# Altium footprint library IC.PcbLib: 108 footprints (part 6 of 8)
Each footprint in its own frame and in the unit in brackets; x right, y up, seen from the top. Pads: shape width x height; smd on the part's side, far side on the other; paste and mask are expansions set on the pad; w line width, h text height; cw(c..) or ccw(c..) is an arc to the next point about the centre after c.
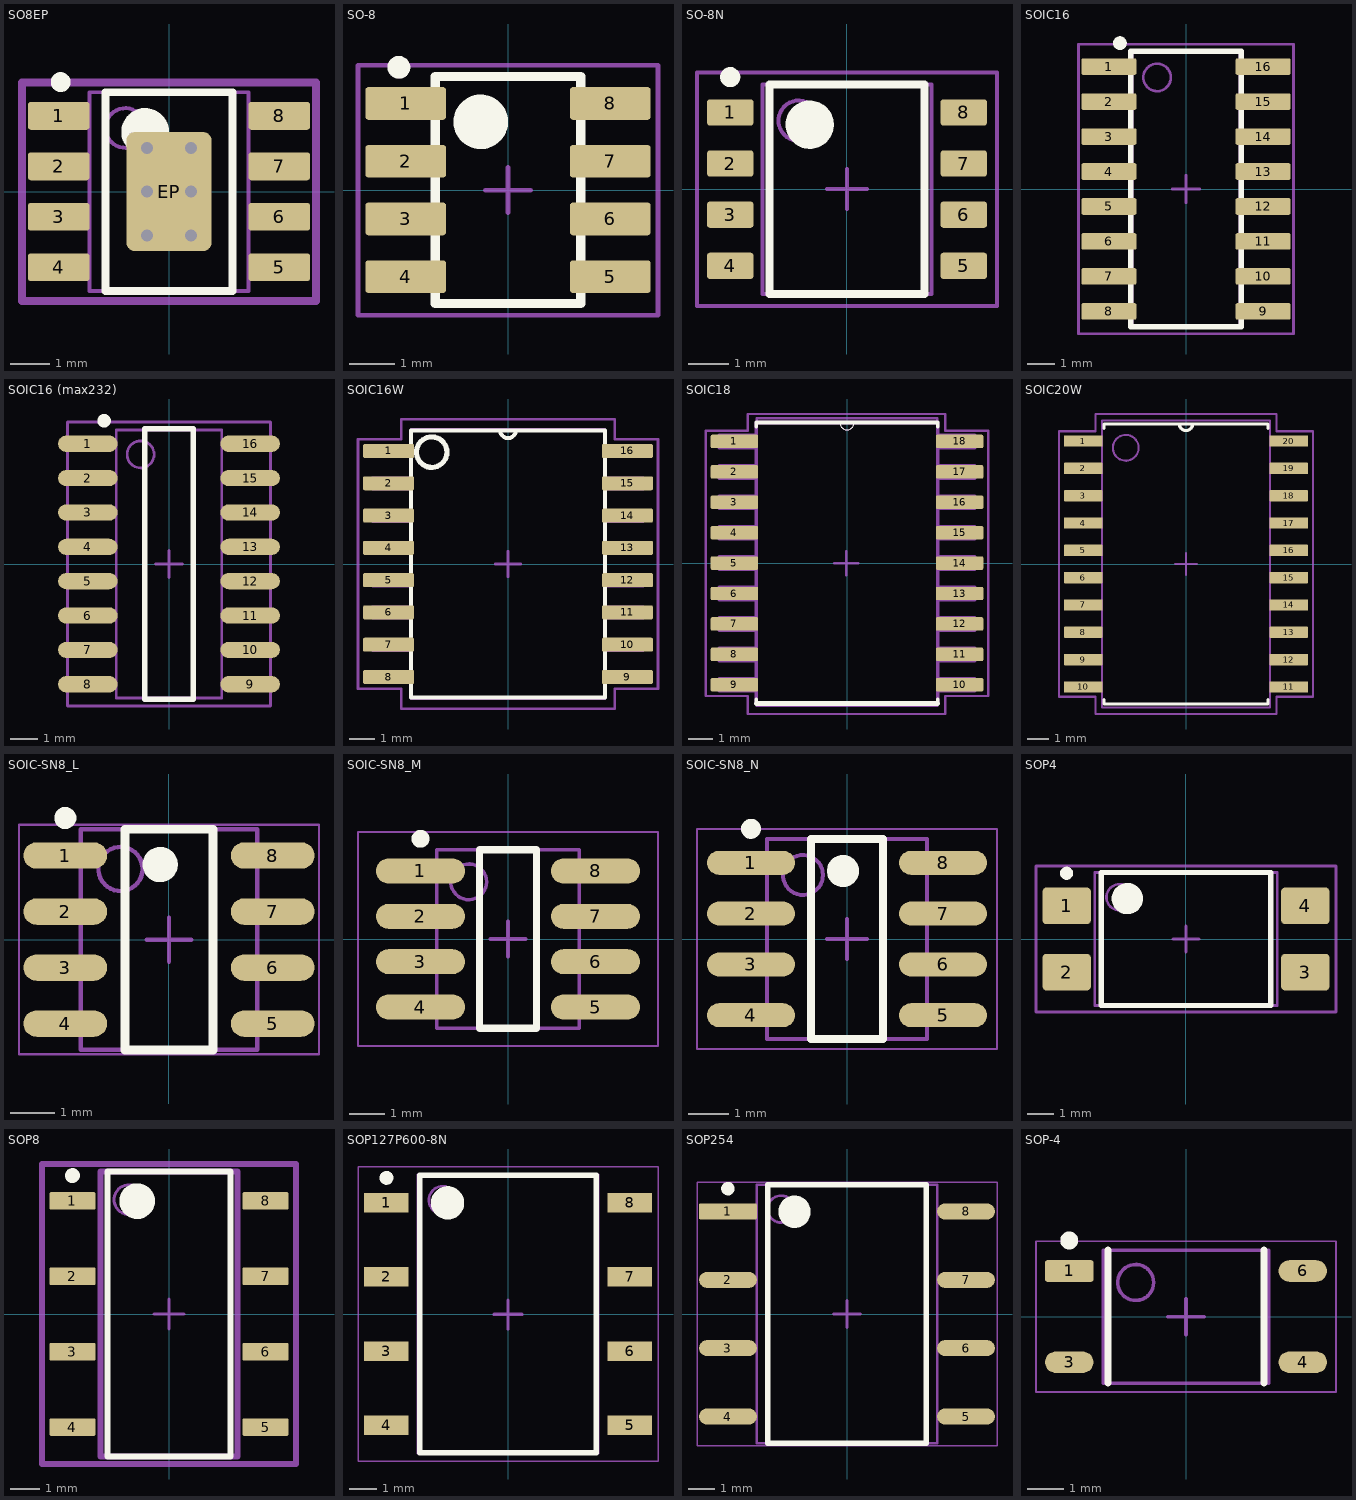
[diagram p5: the footprints below, top view; thin cyan lines are the x and y axes]

## SO8EP [mm] "SOIC, DDA, IPC Medium Density"
height 1.7
pads (9):
  rrect20% 1.55x0.7 smd: 1(-2.775,1.905) 2(-2.775,0.635) 3(-2.775,-0.635) 4(-2.775,-1.905) 5(2.775,-1.905) 6(2.775,-0.635) 7(2.775,0.635) 8(2.775,1.905)
  rrect20% 2.15x3 smd: EP(0,0)
via 0.55,-1.1 diameter 0.7 hole 0.3
via -0.55,-1.1 diameter 0.7 hole 0.3
via 0.55,0 diameter 0.7 hole 0.3
via -0.55,0 diameter 0.7 hole 0.3
via 0.55,1.1 diameter 0.7 hole 0.3
via -0.55,1.1 diameter 0.7 hole 0.3
Top Overlay:
  circle w0.6: c-0.6,1.5 r0.3
  circle w0.25: c-2.725,2.755 r0.125
  lines w0.2: -1.6,-2.5 1.6,-2.5 1.6,2.5 -1.6,2.5 -1.6,-2.5
M3_comm_top:
  text ".comment" at -3,-0.5 h2
M5_asm_top:
  circle w0.1: c-1.1,1.6 r0.5
  lines w0.1: -2,-2.5 2,-2.5 2,2.5 -2,2.5 -2,-2.5
  text ".Designator" at -2.5,3 h2
M7_courtyard_top:
  lines w0.2: -3.7,-2.75 3.7,-2.75 3.7,2.75 -3.7,2.75 -3.7,-2.75 ; -0.5,0 0.5,0 -0.5,0 ; 0,-0.5 0,0.5 0,-0.5
Mechanical 15:
  lines w0.05: -3.775,-2.75 3.775,-2.75 3.775,2.75 -3.775,2.75 -3.775,-2.75
  lines w0.1: -0.5,0 0.5,0 ; 0,-0.5 0,0.5
3D body "SOIC-8-1.step": height 1.75, standoff 0, extent -3,-2.45 3,2.45

## SO-8 [mm] "SOIC-8N,  IPC Medium Density"
height 1.75
pads (8):
  rrect20% 1.78x0.72 smd: 1(-2.25,1.905) 2(-2.25,0.635) 3(-2.25,-0.635) 4(-2.25,-1.905) 5(2.25,-1.905) 6(2.25,-0.635) 7(2.25,0.635) 8(2.25,1.905)
Top Overlay:
  circle w0.6: c-0.6,1.5 r0.3
  circle w0.25: c-2.4,2.7 r0.125
  lines w0.2: -1.6,-2.5 1.6,-2.5 1.6,2.5 -1.6,2.5 -1.6,-2.5
M3_comm_top:
  text ".comment" at 0,0 h1
M5_asm_top:
  circle w0.2: c-2.4,2.7 r0.141
  circle w0.1: c-0.6,1.5 r0.5
  lines w0.1: -1.6,-2.5 -1.6,2.5 1.6,2.5 1.6,-2.5 -1.6,-2.5
  text ".Designator" at -1.3,2.9 h1
M7_courtyard_top:
  lines w0.1: -3.3,-2.75 3.3,-2.75 3.3,2.75 -3.3,2.75 -3.3,-2.75 ; -0.5,0 0.5,0 -0.5,0 ; 0,-0.5 0,0.5 0,-0.5
3D body "SOIC-8-1.step": height 1.75, standoff 0, extent -3,-2.45 3,2.45

## SO-8N [mm] "HCPL-0630-500E, SOIC, 8-Leads, Body 5,14x4,07mm, Pitch 1,27mm, IPC Medium Density"
height 3.18
pads (8):
  rrect20% 1.15x0.65 smd: 1(-2.9,1.905) 2(-2.9,0.635) 3(-2.9,-0.635) 4(-2.9,-1.905) 5(2.9,-1.905) 6(2.9,-0.635) 7(2.9,0.635) 8(2.9,1.905)
Top Overlay:
  circle w0.25: c-2.9,2.78 r0.125
  circle w0.6: c-0.925,1.6 r0.3
  lines w0.2: -1.925,-2.6 -1.925,2.6 1.925,2.6 1.925,-2.6 -1.925,-2.6
M3_comm_top:
  text ".comment" at -1.2,-0.2 h1
M5_asm_top:
  circle w0.1: c-1.2,1.7 r0.5
  lines w0.1: -2.1,-2.6 -2.1,2.6 2.1,2.6 2.1,-2.6 -2.1,-2.6
  text ".Designator" at -1.525,2.775 h1
M7_courtyard_top:
  lines w0.1: -0.5,0 0.5,0 ; 0,-0.5 0,0.5 ; -3.725,-2.9 -3.725,2.9 3.725,2.9 3.725,-2.9 -3.725,-2.9
3D body: height 3.18, standoff 1.52, extent -2.1,-2.6 2.1,2.6

## SOIC16 [mm] "16-Pin Small Outline Integrated Circuit 1.27 mm Pitch, IPC Medium Density"
height 1.75
pads (16):
  rrect20% 2x0.6 smd: 1(-2.8,4.445) 2(-2.8,3.175) 3(-2.8,1.905) 4(-2.8,0.635) 5(-2.8,-0.635) 6(-2.8,-1.905) 7(-2.8,-3.175) 8(-2.8,-4.445) 9(2.8,-4.445) 10(2.8,-3.175) 11(2.8,-1.905) 12(2.8,-0.635) 13(2.8,0.635) 14(2.8,1.905) 15(2.8,3.175) 16(2.8,4.445)
Top Overlay:
  circle w0.25: c-2.4,5.295 r0.125
  lines w0.2: -2,-5 -2,5 2,5 2,-5 -2,-5
M3_comm_top:
  text ".comment" at 0,0 h1
M5_asm_top:
  lines w0.1: -2,-5 -2,5 2,5 2,-5 -2,-5
  lines w0.2: -2.305,5.268 cw(c-2.4,5.3) -2.3,5.3
  text ".Designator" at -2,5.5 h1
M7_courtyard_top:
  lines w0.1: -0.5,0 0.5,0 ; 0,-0.5 0,0.5 ; -3.9,-5.25 -3.9,5.25 3.9,5.25 3.9,-5.25 -3.9,-5.25
Mechanical 13:
  circle w0.1: c-1.05,4.05 r0.5
  lines w0.1: -1.95,-4.95 -1.95,4.95 1.95,4.95 1.95,-4.95 -1.95,-4.95
3D body "SOIC127P600X175-16N.stp": height 1.75, standoff 0, extent -3.1,-5 3.1,5

## SOIC16 (max232) [mm] "16-Pin Small Outline Integrated Circuit 1.27 mm Pitch, IPC Medium Density"
height 1.75
pads (16):
  oval 2.2x0.6 smd: 1(-3,4.445) 2(-3,3.175) 3(-3,1.905) 4(-3,0.635) 5(-3,-0.635) 6(-3,-1.905) 7(-3,-3.175) 8(-3,-4.445) 9(3,-4.445) 10(3,-3.175) 11(3,-1.905) 12(3,-0.635) 13(3,0.635) 14(3,1.905) 15(3,3.175) 16(3,4.445)
Top Overlay:
  circle w0.25: c-2.4,5.295 r0.125
  lines w0.2: -0.9,-5 0.9,-5 0.9,5 -0.9,5 -0.9,-5
Mechanical 13:
  circle w0.1: c-1.05,4.05 r0.5
  lines w0.1: -1.95,-4.95 1.95,-4.95 1.95,4.95 -1.95,4.95 -1.95,-4.95
Mechanical 15:
  lines w0.1: -0.5,0 0.5,0 ; 0,-0.5 0,0.5 ; -3.75,-5.25 3.75,-5.25 3.75,5.25 -3.75,5.25 -3.75,-5.25
3D body "SOIC127P600X175-16N.stp": height 1.75, standoff 0, extent -3.1,-5 3.1,5

## SOIC16W [mm] "ISOW7841DWER, ISOW7840DWER, ADUM4160_SOIC127P1032X265-16"
pads (16):
  rrect20% 2x0.55 smd: 1(-4.699,4.445) 2(-4.699,3.175) 3(-4.699,1.905) 4(-4.699,0.635) 5(-4.699,-0.635) 6(-4.699,-1.905) 7(-4.699,-3.175) 8(-4.699,-4.445) 9(4.699,-4.445) 10(4.699,-3.175) 11(4.699,-1.905) 12(4.699,-0.635) 13(4.699,0.635) 14(4.699,1.905) 15(4.699,3.175) 16(4.699,4.445)
Top Overlay:
  circle w0.2: c-3,4.4 r0.6
  lines w0.152: -3.81,5.055 -3.81,5.258 -0.305,5.258 ; -3.81,5.156 -3.81,-5.055 -3.81,-5.258 3.81,-5.258 3.81,-5.055 ; 3.81,-5.156 3.81,5.055 3.81,5.258 0.305,5.258 ; -0.305,5.258 ccw(c0,5.258) 0.305,5.258 ; -0.305,5.258 0.305,5.258
M3_comm_top:
  text ".comment" at -2.1,-0.2 h1
M4_comm_bot:
  lines w0: -5.334,-4.699 -5.334,-4.191 ; -5.334,-4.699 -3.81,-4.699 ; -5.334,-4.699 -5.334,-4.191 ; -5.334,-4.699 -3.81,-4.699 ; -5.334,-4.191 -3.81,-4.191 ; -5.334,-4.191 -3.81,-4.191 ; -5.334,-3.429 -5.334,-2.921 ; -5.334,-3.429 -3.81,-3.429 ; -5.334,-3.429 -5.334,-2.921 ; -5.334,-3.429 -3.81,-3.429 ; -5.334,-2.921 -3.81,-2.921 ; -5.334,-2.921 -3.81,-2.921 ; -5.334,-2.159 -5.334,-1.651 ; -5.334,-2.159 -3.81,-2.159 ; -5.334,-2.159 -5.334,-1.651 ; -5.334,-2.159 -3.81,-2.159 ; -5.334,-1.651 -3.81,-1.651 ; -5.334,-1.651 -3.81,-1.651 ; -5.334,-0.889 -5.334,-0.381 ; -5.334,-0.889 -3.81,-0.889 ; -5.334,-0.889 -5.334,-0.381 ; -5.334,-0.889 -3.81,-0.889 ; -5.334,-0.381 -3.81,-0.381 ; -5.334,-0.381 -3.81,-0.381 ; -5.334,0.381 -5.334,0.889 ; -5.334,0.381 -3.81,0.381 ; -5.334,0.381 -5.334,0.889 ; -5.334,0.381 -3.81,0.381 ; -5.334,0.889 -3.81,0.889 ; -5.334,0.889 -3.81,0.889 ; -5.334,1.651 -5.334,2.159 ; -5.334,1.651 -3.81,1.651 ; -5.334,1.651 -5.334,2.159 ; -5.334,1.651 -3.81,1.651 ; -5.334,2.159 -3.81,2.159 ; -5.334,2.159 -3.81,2.159 ; -5.334,2.921 -5.334,3.429 ; -5.334,2.921 -3.81,2.921 ; -5.334,2.921 -5.334,3.429 ; -5.334,2.921 -3.81,2.921 ; -5.334,3.429 -3.81,3.429 ; -5.334,3.429 -3.81,3.429 ; -5.334,4.191 -5.334,4.699 ; -5.334,4.191 -3.81,4.191 ; -5.334,4.191 -5.334,4.699 ; -5.334,4.191 -3.81,4.191 ; -5.334,4.699 -3.81,4.699 ; -5.334,4.699 -3.81,4.699 ; -3.81,-5.258 3.81,-5.258 ; -3.81,-5.258 -3.81,5.258 ; -3.81,-5.258 3.81,-5.258 ; -3.81,-5.258 -3.81,5.258 ; -3.81,-4.699 -3.81,-4.191 ; -3.81,-4.699 -3.81,-4.191 ; -3.81,-3.429 -3.81,-2.921 ; -3.81,-3.429 -3.81,-2.921 ; -3.81,-2.159 -3.81,-1.651 ; -3.81,-2.159 -3.81,-1.651 ; -3.81,-0.889 -3.81,-0.381 ; -3.81,-0.889 -3.81,-0.381 ; -3.81,0.381 -3.81,0.889 ; -3.81,0.381 -3.81,0.889 ; -3.81,1.651 -3.81,2.159 ; -3.81,1.651 -3.81,2.159 ; -3.81,2.921 -3.81,3.429 ; -3.81,2.921 -3.81,3.429 ; -3.81,4.191 -3.81,4.699 ; -3.81,4.191 -3.81,4.699 ; -3.81,5.258 -0.305,5.258 ; -3.81,5.258 -0.305,5.258 ; -0.305,5.258 ccw(c0,5.258) 0.305,5.258 ; -0.305,5.258 ccw(c0,5.258) 0.305,5.258 ; -0.305,5.258 0.305,5.258 ; -0.305,5.258 0.305,5.258 ; 0.305,5.258 3.81,5.258 ; 0.305,5.258 3.81,5.258 ; 3.81,-5.258 3.81,5.258 ; 3.81,-5.258 3.81,5.258 ; 3.81,-4.699 3.81,-4.191 ; 3.81,-4.699 5.334,-4.699 ; 3.81,-4.699 3.81,-4.191 ; 3.81,-4.699 5.334,-4.699 ; 3.81,-4.191 5.334,-4.191 ; 3.81,-4.191 5.334,-4.191 ; 3.81,-3.429 3.81,-2.921 ; 3.81,-3.429 5.334,-3.429 ; 3.81,-3.429 3.81,-2.921 ; 3.81,-3.429 5.334,-3.429 ; 3.81,-2.921 5.334,-2.921 ; 3.81,-2.921 5.334,-2.921 ; 3.81,-2.159 3.81,-1.651 ; 3.81,-2.159 5.334,-2.159 ; 3.81,-2.159 3.81,-1.651 ; 3.81,-2.159 5.334,-2.159 ; 3.81,-1.651 5.334,-1.651 ; 3.81,-1.651 5.334,-1.651 ; 3.81,-0.889 3.81,-0.381 ; 3.81,-0.889 5.334,-0.889 ; 3.81,-0.889 3.81,-0.381 ; 3.81,-0.889 5.334,-0.889 ; 3.81,-0.381 5.334,-0.381 ; 3.81,-0.381 5.334,-0.381 ; 3.81,0.381 3.81,0.889 ; 3.81,0.381 5.334,0.381 ; 3.81,0.381 3.81,0.889 ; 3.81,0.381 5.334,0.381 ; 3.81,0.889 5.334,0.889 ; 3.81,0.889 5.334,0.889 ; 3.81,1.651 3.81,2.159 ; 3.81,1.651 5.334,1.651 ; 3.81,1.651 3.81,2.159 ; 3.81,1.651 5.334,1.651 ; 3.81,2.159 5.334,2.159 ; 3.81,2.159 5.334,2.159 ; 3.81,2.921 3.81,3.429 ; 3.81,2.921 5.334,2.921 ; 3.81,2.921 3.81,3.429 ; 3.81,2.921 5.334,2.921 ; 3.81,3.429 5.334,3.429 ; 3.81,3.429 5.334,3.429 ; 3.81,4.191 3.81,4.699 ; 3.81,4.191 5.334,4.191 ; 3.81,4.191 3.81,4.699 ; 3.81,4.191 5.334,4.191 ; 3.81,4.699 5.334,4.699 ; 3.81,4.699 5.334,4.699 ; 5.334,-4.699 5.334,-4.191 ; 5.334,-4.699 5.334,-4.191 ; 5.334,-3.429 5.334,-2.921 ; 5.334,-3.429 5.334,-2.921 ; 5.334,-2.159 5.334,-1.651 ; 5.334,-2.159 5.334,-1.651 ; 5.334,-0.889 5.334,-0.381 ; 5.334,-0.889 5.334,-0.381 ; 5.334,0.381 5.334,0.889 ; 5.334,0.381 5.334,0.889 ; 5.334,1.651 5.334,2.159 ; 5.334,1.651 5.334,2.159 ; 5.334,2.921 5.334,3.429 ; 5.334,2.921 5.334,3.429 ; 5.334,4.191 5.334,4.699 ; 5.334,4.191 5.334,4.699
M5_asm_top:
  circle w0.1: c-3,4.4 r0.6
  lines w0.1: -3.8,-5.3 -3.8,5.3 3.8,5.3 3.8,-5.3 -3.8,-5.3
  text ".Designator" at -2,5.5 h1
M7_courtyard_top:
  lines w0.1: -0.5,0 0.5,0 ; 0,-0.5 0,0.5 ; -5.9,-4.9 -4.2,-4.9 -4.2,-5.7 4.2,-5.7 4.2,-4.9 5.9,-4.9 5.9,-4.2 5.9,4.9 4.2,4.9 4.2,5.7 -4.2,5.7 -4.2,4.9 -5.9,4.9 -5.9,-4.9
3D body "SOIC16_Wide_JEDEC_MS-013AA.step": height 2.67, standoff 0.02, extent -5.315,-5.25 5.315,5.25

## SOIC18 [mil]
pads (18):
  rrect20% 78x22 smd: 1(-185,200) 2(-185,150) 3(-185,100) 4(-185,50) 5(-185,0) 6(-185,-50) 7(-185,-100) 8(-185,-150) 9(-185,-200) 10(185,-200) 11(185,-150) 12(185,-100) 13(185,-50) 14(185,0) 15(185,50) 16(185,100) 17(185,150) 18(185,200)
Top Overlay:
  lines w0: -12,231 ccw(c0,231) 12,231
  lines w6: -149,-231 -149,-224 ; -149,224 -149,231 -12,231 12,231 149,231 149,224 ; 149,-231 149,-224
  lines w7.87: -149,-231 149,-231
M1_3D_TOP:
  lines w0: -12,231 ccw(c0,231) 12,231
  lines w6: -210,-210 -149,-210 -149,-190 -210,-190 -210,-210 ; -210,-160 -149,-160 -149,-140 -210,-140 -210,-160 ; -210,-110 -149,-110 -149,-90 -210,-90 -210,-110 ; -210,-60 -149,-60 -149,-40 -210,-40 -210,-60 ; -210,-10 -149,-10 -149,10 -210,10 -210,-10 ; -210,40 -149,40 -149,60 -210,60 -210,40 ; -210,90 -149,90 -149,110 -210,110 -210,90 ; -210,140 -149,140 -149,160 -210,160 -210,140 ; -210,190 -149,190 -149,210 -210,210 -210,190 ; -149,-231 -149,231 -12,231 12,231 149,231 149,-231 -149,-231 ; 149,-210 210,-210 210,-190 149,-190 149,-210 ; 149,-160 210,-160 210,-140 149,-140 149,-160 ; 149,-110 210,-110 210,-90 149,-90 149,-110 ; 149,-60 210,-60 210,-40 149,-40 149,-60 ; 149,-10 210,-10 210,10 149,10 149,-10 ; 149,40 210,40 210,60 149,60 149,40 ; 149,90 210,90 210,110 149,110 149,90 ; 149,140 210,140 210,160 149,160 149,140 ; 149,190 210,190 210,210 149,210 149,190
M3_comm_top:
  text ".comment" at -117.13,-18.7 h78.74
M5_asm_top:
  lines w3.94: -148.62,-234.25 148.62,-234.25 148.62,238.19 -148.62,238.19 -148.62,-234.25
  text ".Designator" at -114.17,251.97 h78.74
M7_courtyard_top:
  lines w3.94: -20.67,0 18.7,0 ; -0.98,-19.68 -0.98,19.68 ; -163.39,245.08 53.15,245.08 161.42,245.08 161.42,217.52 232.28,217.52 232.28,-218.5 229.33,-218.5 161.42,-218.5 161.42,-248.03 -163.39,-248.03 -163.39,-218.5 -232.28,-218.5 -232.28,217.52 -163.39,217.52 -163.39,245.08 ; -163.39,245.08 -163.39,245.08
3D body "User Library-SOIC18-300.step": height 104.33, standoff 0, extent -202.76,-226.97 202.75,226.97

## SOIC20W [mil]
pads (20):
  rrect20% 71x21 smd: 1(-188,225) 2(-188,175) 3(-188,125) 4(-188,75) 5(-188,25) 6(-188,-25) 7(-188,-75) 8(-188,-125) 9(-188,-175) 10(-188,-225) 11(188,-225) 12(188,-175) 13(188,-125) 14(188,-75) 15(188,-25) 16(188,25) 17(188,75) 18(188,125) 19(188,175) 20(188,225)
Top Overlay:
  lines w6: -150,-248 -150,-256 150,-256 150,-248 ; -150,248 -150,256 -12,256 ; 150,248 150,256 12,256 ; -12,256 ccw(c0,256) 12,256 ; -12,256 12,256
M3_comm_top:
  text ".comment" at -52.17,-10.83 h39.37
M5_asm_top:
  circle w3.94: c-110.24,212.6 r23.62
  lines w3.94: -153.54,-262.6 -153.54,262.6 153.54,262.6 153.54,-262.6 -153.54,-262.6
  text ".Designator" at -62.01,285.43 h39.37
M7_courtyard_top:
  lines w3.94: -19.69,0 19.68,0 ; 0,-19.68 0,19.68 ; -232.28,-242.91 -165.35,-242.91 -165.35,-274.41 165.35,-274.41 165.35,-242.91 232.28,-242.91 232.28,242.91 165.35,242.91 165.35,274.41 -165.35,274.41 -165.35,242.91 -232.28,242.91 -232.28,-242.91
3D body "User Library-SOIC20_W.STEP": height 104.33, standoff 0, extent -209.64,-255.9 209.65,255.9

## SOIC-SN8_L [mm] "SOIC, 8-Leads, Body 4.9x3.8mm, Pitch 1.27mm, IPC High Density"
height 1.75
pads (8):
  oval 1.9x0.6 smd: 1(-2.35,1.905) 2(-2.35,0.635) 3(-2.35,-0.635) 4(-2.35,-1.905) 5(2.35,-1.905) 6(2.35,-0.635) 7(2.35,0.635) 8(2.35,1.905)
Top Overlay:
  circle w0.25: c-2.35,2.755 r0.125
  circle w0.4: c-0.2,1.7 r0.2
  lines w0.2: -1,-2.5 -1,2.5 1,2.5 1,-2.5 -1,-2.5
Mechanical 13:
  circle w0.1: c-1.1,1.6 r0.5
  lines w0.1: -2,-2.5 -2,2.5 2,2.5 2,-2.5 -2,-2.5
Mechanical 15:
  lines w0.05: -3.4,-2.6 -3.4,2.6 3.4,2.6 3.4,-2.6 -3.4,-2.6
  lines w0.1: -0.5,0 0.5,0 ; 0,-0.5 0,0.5
3D body: height 1.75, standoff 0.1, extent -2,-2.5 2,2.5

## SOIC-SN8_M [mm] "SOIC, 8-Leads, Body 4.9x3.8mm, Pitch 1.27mm, IPC Low Density"
height 1.75
pads (8):
  oval 2.5x0.7 smd: 1(-2.45,1.905) 2(-2.45,0.635) 3(-2.45,-0.635) 4(-2.45,-1.905) 5(2.45,-1.905) 6(2.45,-0.635) 7(2.45,0.635) 8(2.45,1.905)
Top Overlay:
  circle w0.25: c-2.45,2.805 r0.125
  lines w0.2: -0.8,-2.5 -0.8,2.5 0.8,2.5 0.8,-2.5 -0.8,-2.5
Mechanical 13:
  circle w0.1: c-1.1,1.6 r0.5
  lines w0.1: -2,-2.5 -2,2.5 2,2.5 2,-2.5 -2,-2.5
Mechanical 15:
  lines w0.05: -4.2,-3 -4.2,3 4.2,3 4.2,-3 -4.2,-3
  lines w0.1: -0.5,0 0.5,0 ; 0,-0.5 0,0.5
3D body: height 1.75, standoff 0.1, extent -2,-2.5 2,2.5

## SOIC-SN8_N [mm] "SOIC, 8-Leads, Body 4.9x3.8mm, Pitch 1.27mm, IPC Medium Density"
height 1.75
pads (8):
  oval 2.2x0.6 smd: 1(-2.4,1.905) 2(-2.4,0.635) 3(-2.4,-0.635) 4(-2.4,-1.905) 5(2.4,-1.905) 6(2.4,-0.635) 7(2.4,0.635) 8(2.4,1.905)
Top Overlay:
  circle w0.4: c-0.1,1.7 r0.2
  circle w0.25: c-2.4,2.755 r0.125
  lines w0.2: -0.9,-2.5 0.9,-2.5 0.9,2.5 -0.9,2.5 -0.9,-2.5
Mechanical 13:
  circle w0.1: c-1.1,1.6 r0.5
  lines w0.1: -2,-2.5 2,-2.5 2,2.5 -2,2.5 -2,-2.5
Mechanical 15:
  lines w0.05: -3.75,-2.75 3.75,-2.75 3.75,2.75 -3.75,2.75 -3.75,-2.75
  lines w0.1: -0.5,0 0.5,0 ; 0,-0.5 0,0.5
3D body: height 1.75, standoff 0.1, extent -2,-2.5 2,2.5

## SOP4 [mm] "LTV-817S, SOP, 4-Leads, Body 5,10x7,00mm, Pitch 2,54mm, IPC Medium Density"
height 4.3
pads (4):
  rrect20% 1.85x1.4 smd: 1(-4.575,1.27) 2(-4.575,-1.27) 3(4.575,-1.27) 4(4.575,1.27)
Top Overlay:
  circle w0.25: c-4.575,2.52 r0.125
  circle w0.6: c-2.25,1.55 r0.3
  lines w0.2: -3.25,-2.55 -3.25,2.55 3.25,2.55 3.25,-2.55 -3.25,-2.55
M3_comm_top:
  text ".comment" at -1.4,-0.3 h1
M5_asm_top:
  circle w0.1: c-2.55,1.6 r0.5
  lines w0.1: -3.5,-2.55 -3.5,2.55 3.5,2.55 3.5,-2.55 -3.5,-2.55
  text ".Designator" at -1.5,1 h1
M7_courtyard_top:
  lines w0.1: -0.5,0 0.5,0 ; 0,-0.5 0,0.5 ; -5.75,-2.8 -5.75,2.8 5.75,2.8 5.75,-2.8 -5.75,-2.8
3D body "SOP4.step": height 4.3, standoff 0, extent -5.08,-2.55 5.08,2.55

## SOP8 [mm] "PRAC34S"
height 2
pads (8):
  rrect20% 1.55x0.6 smd: 1(-3.25,3.81) 2(-3.25,1.27) 3(-3.25,-1.27) 4(-3.25,-3.81) 5(3.25,-3.81) 6(3.25,-1.27) 7(3.25,1.27) 8(3.25,3.81)
Top Overlay:
  circle w0.6: c-1.075,3.8 r0.3
  circle w0.25: c-3.25,4.66 r0.125
  lines w0.2: -2.075,-4.8 2.075,-4.8 2.075,4.8 -2.075,4.8 -2.075,-4.8
M3_comm_top:
  text ".comment" at -3,-0.5 h2
M5_asm_top:
  circle w0.1: c-1.35,3.85 r0.5
  lines w0.2: -2.3,-4.8 2.3,-4.8 2.3,4.8 -2.3,4.8 -2.3,-4.8
  text ".Designator" at -2,5.5 h2
M7_courtyard_top:
  lines w0.1: -0.5,0 0.5,0 ; 0,-0.5 0,0.5
  lines w0.2: -4.275,-5.05 4.275,-5.05 4.275,5.05 -4.275,5.05 -4.275,-5.05
3D body "SOP8.step": height 2, standoff 0, extent -3.6,-4.8 3.6,4.8

## SOP127P600-8N [mm]
height 2.29
pads (8):
  rect 1.6x0.7 smd: 1(-4.375,4) 2(-4.375,1.333) 3(-4.375,-1.333) 4(-4.375,-4) 5(4.375,-4) 6(4.375,-1.333) 7(4.375,1.333) 8(4.375,4)
Top Overlay:
  circle w0.25: c-4.375,4.901 r0.125
  circle w0.6: c-2.175,4 r0.3
  lines w0.2: -3.175,-5 -3.175,5 3.175,5 3.175,-5 -3.175,-5
M3_comm_top:
  text ".comment" at -2.975,-0.5 h2
M5_asm_top:
  text ".Designator" at -3.025,3 h2
M7_courtyard_top:
  lines w0.1: -0.5,-0.025 0.5,-0.025 ; 0,-0.55 0,0.45
Mechanical 13:
  circle w0.1: c-2.35,4.1 r0.5
  lines w0.1: -3.25,-5 -3.25,5 3.25,5 3.25,-5 -3.25,-5
Mechanical 15:
  lines w0.05: -5.4,-5.3 -5.4,5.3 5.4,5.3 5.4,-5.3 -5.4,-5.3
  lines w0.1: -0.5,0 0.5,0 ; 0,-0.5 0,0.5
3D body: height 2.29, standoff 0.1, extent -3.25,-5 3.25,5

## SOP254 [mm] "SOP, IPC High Density, AMC1100"
height 4.85
pads (8):
  rrect20% 2.15x0.6 smd: 1(-4.425,3.81)
  oval 2.15x0.6 smd: 2(-4.425,1.27) 3(-4.425,-1.27) 4(-4.425,-3.81) 5(4.425,-3.81) 6(4.425,-1.27) 7(4.425,1.27) 8(4.425,3.81)
Top Overlay:
  circle w0.25: c-4.425,4.66 r0.125
  circle w0.6: c-1.95,3.8 r0.3
  lines w0.2: -2.95,-4.8 -2.95,4.8 2.95,4.8 2.95,-4.8 -2.95,-4.8
Mechanical 13:
  circle w0.1: c-2.45,3.9 r0.5
  lines w0.1: -3.35,-4.8 -3.35,4.8 3.35,4.8 3.35,-4.8 -3.35,-4.8
Mechanical 15:
  lines w0.05: -5.575,-4.9 -5.575,4.9 5.575,4.9 5.575,-4.9 -5.575,-4.9
  lines w0.1: -0.5,0 0.5,0 ; 0,-0.5 0,0.5
3D body "SOP254.step": height 4.85, standoff 0, extent -5.15,-4.8 5.15,4.8

## SOP-4 [mm] "SOP-4, IPC Medium Density"
height 2.2
pads (4):
  rrect20% 1.35x0.6 smd: 1(-3.25,1.27)
  oval 1.35x0.6 smd: 3(-3.25,-1.27) 4(3.25,-1.27) 6(3.25,1.27)
Top Overlay:
  circle w0.25: c-3.25,2.12 r0.125
  lines w0.2: -2.175,-1.85 -2.175,1.85 ; 2.175,-1.85 2.175,1.85
Mechanical 13:
  circle w0.1: c-1.4,0.95 r0.5
  lines w0.1: -2.3,-1.85 -2.3,1.85 2.3,1.85 2.3,-1.85 -2.3,-1.85
Mechanical 15:
  lines w0.05: -4.175,-2.1 -4.175,2.1 4.175,2.1 4.175,-2.1 -4.175,-2.1
  lines w0.1: -0.5,0 0.5,0 ; 0,-0.5 0,0.5
3D body "SOP254P665X290.step": height 2.9, standoff 0, extent -3.343,-2.475 3.343,2.475